# Altium schematic symbol library FPGA_Xilinx_Virtex7.SchLib: 34 symbols (part 8 of 34)
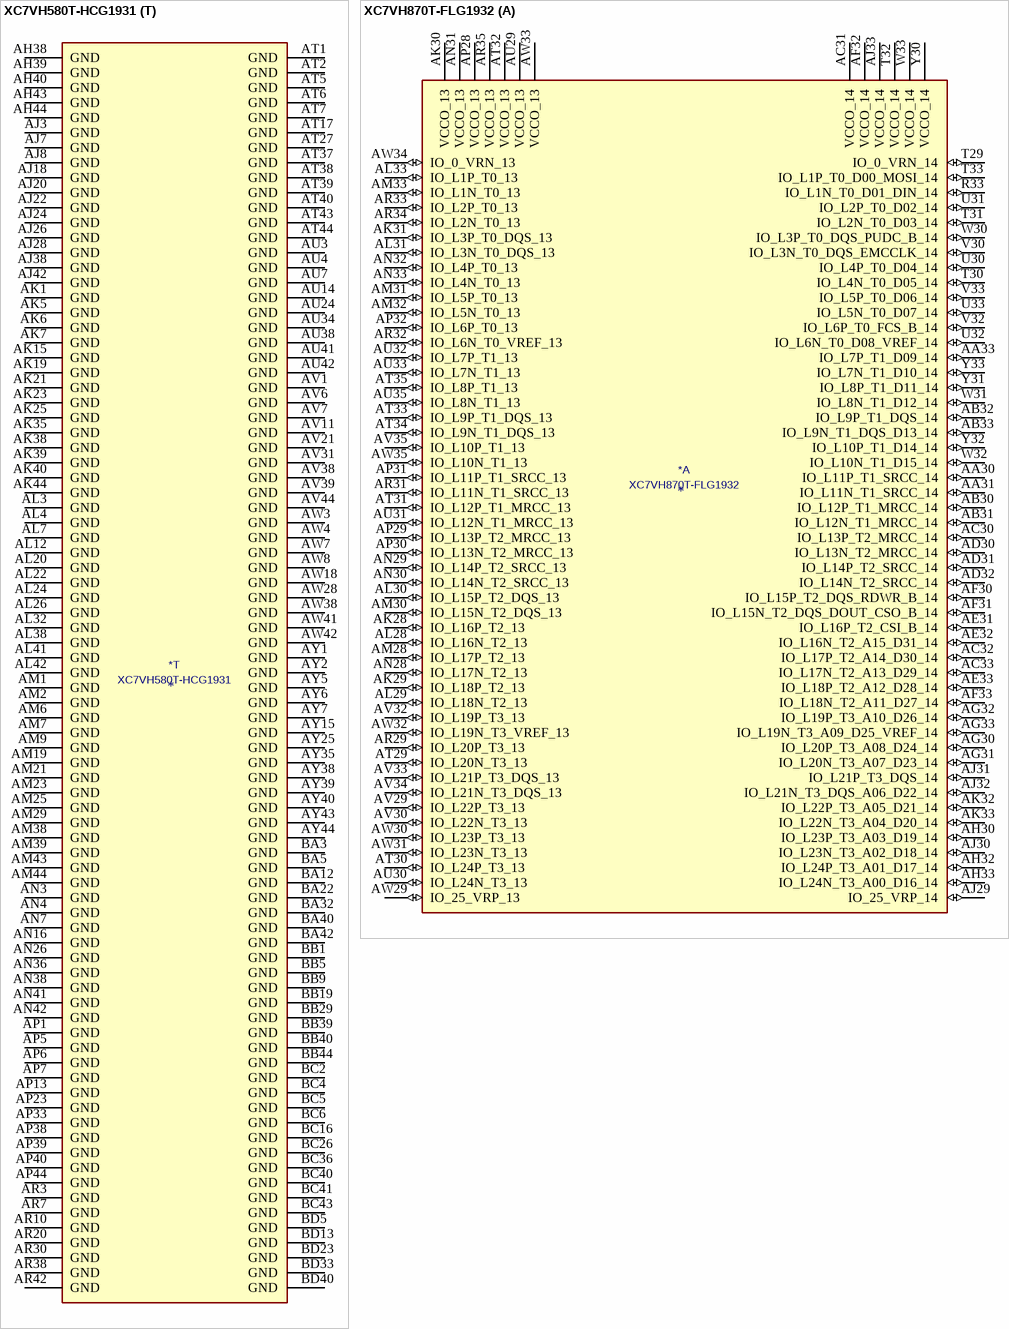
[diagram p179: symbols XC7VH580T-HCG1931 to XC7VH870T-FLG1932]

## XC7VH580T-HCG1931
designator *  value XC7VH580T-HCG1931
ki_keywords: FPGA; ki_description: Virtex 7 HT 580 XC7VH580T-FLG1931
part A pins: AH30 IO_L20P_T3_A08_D24_14 (io), AJ30 IO_L20N_T3_A07_D23_14 (io), AJ31 IO_L16P_T2_CSI_B_14 (io), AJ32 IO_L7P_T1_D09_14 (io), AK30 VCCO_14 (power), AK31 IO_L16N_T2_A15_D31_14 (io), AK32 IO_L7N_T1_D10_14 (io), AL30 IO_L24P_T3_A01_D17_14 (io), AL31 IO_L18P_T2_A12_D28_14 (io), AL35 IO_L1P_T0_13 (io), AL36 IO_L3P_T0_DQS_13 (io), AL37 VCCO_13 (power), AM30 IO_L24N_T3_A00_D16_14 (io), AM31 IO_L18N_T2_A11_D27_14 (io), AM32 IO_L9P_T1_DQS_14 (io), AM33 IO_L5P_T0_D06_14 (io), AM34 VCCO_13 (power), AM35 IO_L1N_T0_13 (io), AM36 IO_L3N_T0_DQS_13 (io), AM37 IO_L5P_T0_13 (io), AN30 IO_L22P_T3_A05_D21_14 (io), AN31 VCCO_14 (power), AN32 IO_L9N_T1_DQS_D13_14 (io), AN33 IO_L5N_T0_D07_14 (io), AN34 IO_L4P_T0_13 (io), AN35 IO_L2P_T0_13 (io), AN37 IO_L5N_T0_13 (io), AP30 IO_L22N_T3_A04_D20_14 (io), AP31 IO_L13P_T2_MRCC_14 (io), AP32 IO_L11P_T1_SRCC_14 (io), AP34 IO_L4N_T0_13 (io), AP35 IO_L2N_T0_13 (io), AP36 IO_L6P_T0_13 (io), AP37 IO_L7P_T1_13 (io), AR31 IO_L13N_T2_MRCC_14 (io), AR32 IO_L11N_T1_SRCC_14 (io), AR33 IO_L1P_T0_D00_MOSI_14 (io), AR34 IO_L10P_T1_13 (io), AR35 VCCO_13 (power), AR36 IO_L6N_T0_VREF_13 (io), AR37 IO_L7N_T1_13 (io), AT30 IO_L21P_T3_DQS_14 (io), AT31 IO_L14P_T2_SRCC_14 (io), AT32 VCCO_14 (power), AT33 IO_L1N_T0_D01_DIN_14 (io), AT34 IO_L10N_T1_13 (io), AT35 IO_L11P_T1_SRCC_13 (io), AT36 IO_L12P_T1_MRCC_13 (io), AU30 IO_L21N_T3_DQS_A06_D22_14 (io), AU31 IO_L14N_T2_SRCC_14 (io), AU32 IO_L12P_T1_MRCC_14 (io), AU33 IO_L3P_T0_DQS_PUDC_B_14 (io), AU35 IO_L11N_T1_SRCC_13 (io), AU36 IO_L12N_T1_MRCC_13 (io), AU37 IO_L9P_T1_DQS_13 (io), AV30 IO_L23P_T3_A03_D19_14 (io), AV32 IO_L12N_T1_MRCC_14 (io), AV33 IO_L3N_T0_DQS_EMCCLK_14 (io), AV34 IO_L16P_T2_13 (io), AV35 IO_L13P_T2_MRCC_13 (io), AV36 VCCO_13 (power), AV37 IO_L9N_T1_DQS_13 (io), AW30 IO_L23N_T3_A02_D18_14 (io), AW31 IO_L15P_T2_DQS_RDWR_B_14 (io), AW32 IO_L8P_T1_D11_14 (io), AW33 VCCO_14 (power), AW34 IO_L16N_T2_13 (io), AW35 IO_L13N_T2_MRCC_13 (io), AW36 IO_L14P_T2_SRCC_13 (io), AW37 IO_L8P_T1_13 (io), AY30 VCCO_14 (power), AY31 IO_L15N_T2_DQS_DOUT_CSO_B_14 (io), AY32 IO_L8N_T1_D12_14 (io), AY33 IO_L4P_T0_D04_14 (io), AY34 IO_L17P_T2_13 (io), AY36 IO_L14N_T2_SRCC_13 (io), AY37 IO_L8N_T1_13 (io), BA30 IO_L19P_T3_A10_D26_14 (io), BA31 IO_L17P_T2_A14_D30_14 (io), BA33 IO_L4N_T0_D05_14 (io), BA34 IO_L17N_T2_13 (io), BA35 IO_L15P_T2_DQS_13 (io), BA36 IO_L18P_T2_13 (io), BA37 VCCO_13 (power), BA38 IO_L22P_T3_13 (io), BA39 IO_L22N_T3_13 (io), BB30 IO_L19N_T3_A09_D25_VREF_14 (io), BB31 IO_L17N_T2_A13_D29_14 (io), BB32 IO_L10P_T1_D14_14 (io), BB33 IO_L6P_T0_FCS_B_14 (io), BB34 VCCO_13 (power), BB35 IO_L15N_T2_DQS_13 (io), BB36 IO_L18N_T2_13 (io), BB37 IO_L21P_T3_DQS_13 (io), BB38 IO_L19P_T3_13 (io), BC30 IO_25_VRP_14 (io), BC31 VCCO_14 (power), BC32 IO_L10N_T1_D15_14 (io), BC33 IO_L6N_T0_D08_VREF_14 (io), BC34 IO_L23P_T3_13 (io), BC35 IO_L24P_T3_13 (io), BC37 IO_L21N_T3_DQS_13 (io), BC38 IO_L19N_T3_VREF_13 (io), BC39 IO_25_VRP_13 (io), BD30 IO_0_VRN_14 (io), BD31 IO_L2P_T0_D02_14 (io), BD32 IO_L2N_T0_D03_14 (io), BD34 IO_L23N_T3_13 (io), BD35 IO_L24N_T3_13 (io), BD36 IO_L20P_T3_13 (io), BD37 IO_L20N_T3_13 (io), BD38 VCCO_13 (power), BD39 IO_0_VRN_13 (io)
part B pins: AA33 IO_L2P_T0_16 (io), AA34 IO_L2N_T0_16 (io), AA35 IO_L3P_T0_DQS_16 (io), AA36 IO_L3N_T0_DQS_16 (io), AA37 VCCO_16 (power), AB32 IO_L1P_T0_16 (io), AB33 IO_L1N_T0_16 (io), AB34 VCCO_16 (power), AB35 IO_L5P_T0_16 (io), AB36 IO_L6P_T0_16 (io), AB37 IO_L6N_T0_VREF_16 (io), AC31 VCCO_16 (power), AC32 IO_L16P_T2_16 (io), AC33 IO_L4P_T0_16 (io), AC34 IO_L4N_T0_16 (io), AC35 IO_L5N_T0_16 (io), AC37 IO_L7P_T1_16 (io), AD32 IO_L16N_T2_16 (io), AD34 IO_L10P_T1_16 (io), AD35 IO_L8P_T1_16 (io), AD36 IO_L8N_T1_16 (io), AD37 IO_L7N_T1_16 (io), AE32 IO_L15P_T2_DQS_16 (io), AE33 IO_L15N_T2_DQS_16 (io), AE34 IO_L10N_T1_16 (io), AE35 VCCO_16 (power), AE36 IO_L9P_T1_DQS_16 (io), AE37 IO_L9N_T1_DQS_16 (io), AF32 VCCO_16 (power), AF33 IO_L11P_T1_SRCC_16 (io), AF34 IO_L11N_T1_SRCC_16 (io), AF35 IO_L12P_T1_MRCC_16 (io), AF36 IO_L12N_T1_MRCC_16 (io), AG31 IO_L17P_T2_16 (io), AG32 IO_L13P_T2_MRCC_16 (io), AG33 IO_L13N_T2_MRCC_16 (io), AG35 IO_L14P_T2_SRCC_16 (io), AG36 IO_L14N_T2_SRCC_16 (io), AG37 IO_L20P_T3_16 (io), AH32 IO_L17N_T2_16 (io), AH33 IO_L18P_T2_16 (io), AH34 IO_L18N_T2_16 (io), AH35 IO_L24P_T3_16 (io), AH36 VCCO_16 (power), AH37 IO_L20N_T3_16 (io), AJ33 VCCO_16 (power), AJ34 IO_L19P_T3_16 (io), AJ35 IO_L24N_T3_16 (io), AJ36 IO_L21P_T3_DQS_16 (io), AJ37 IO_L21N_T3_DQS_16 (io), AK27 IO_25_VRP_15 (io), AK28 IO_L18P_T2_A24_15 (io), AK29 IO_L22P_T3_A17_15 (io), AK33 IO_L23P_T3_16 (io), AK34 IO_L19N_T3_VREF_16 (io), AK36 IO_L22P_T3_16 (io), AK37 IO_L22N_T3_16 (io), AL27 VCCO_15 (power), AL28 IO_L18N_T2_A23_15 (io), AL29 IO_L22N_T3_A16_15 (io), AL33 IO_L23N_T3_16 (io), AL34 IO_25_VRP_16 (io), AM27 IO_L7P_T1_AD2P_15 (io), AM28 IO_L16P_T2_A28_15 (io), AN25 IO_L1P_T0_AD0P_15 (io), AN27 IO_L7N_T1_AD2N_15 (io), AN28 IO_L16N_T2_A27_15 (io), AN29 IO_L20P_T3_A20_15 (io), AP25 IO_L1N_T0_AD0N_15 (io), AP26 IO_L5P_T0_AD9P_15 (io), AP27 IO_L9P_T1_DQS_AD3P_15 (io), AP28 VCCO_15 (power), AP29 IO_L20N_T3_A19_15 (io), AR25 VCCO_15 (power), AR26 IO_L5N_T0_AD9N_15 (io), AR27 IO_L9N_T1_DQS_AD3N_15 (io), AR28 IO_L14P_T2_SRCC_15 (io), AR29 IO_L24P_T3_RS1_15 (io), AT25 IO_L4P_T0_15 (io), AT26 IO_L3P_T0_DQS_AD1P_15 (io), AT28 IO_L14N_T2_SRCC_15 (io), AT29 IO_L24N_T3_RS0_15 (io), AU25 IO_L4N_T0_15 (io), AU26 IO_L3N_T0_DQS_AD1N_15 (io), AU27 IO_L11P_T1_SRCC_15 (io), AU28 IO_L13P_T2_MRCC_15 (io), AU29 VCCO_15 (power), AV25 IO_0_VRN_15 (io), AV26 VCCO_15 (power), AV27 IO_L11N_T1_SRCC_15 (io), AV28 IO_L13N_T2_MRCC_15 (io), AV29 IO_L21P_T3_DQS_15 (io), AW26 IO_L6P_T0_15 (io), AW27 IO_L12P_T1_MRCC_15 (io), AW29 IO_L21N_T3_DQS_A18_15 (io), AY26 IO_L6N_T0_VREF_15 (io), AY27 IO_L12N_T1_MRCC_15 (io), AY28 IO_L15P_T2_DQS_15 (io), AY29 IO_L19P_T3_A22_15 (io), BA26 IO_L2P_T0_AD8P_15 (io), BA27 VCCO_15 (power), BA28 IO_L15N_T2_DQS_ADV_B_15 (io), BA29 IO_L19N_T3_A21_VREF_15 (io), BB26 IO_L2N_T0_AD8N_15 (io), BB27 IO_L10P_T1_AD11P_15 (io), BB28 IO_L17P_T2_A26_15 (io), BC27 IO_L10N_T1_AD11N_15 (io), BC28 IO_L17N_T2_A25_15 (io), BC29 IO_L23P_T3_FOE_B_15 (io), BD26 IO_L8P_T1_AD10P_15 (io), BD27 IO_L8N_T1_AD10N_15 (io), BD28 VCCO_15 (power), BD29 IO_L23N_T3_FWE_B_15 (io), Y37 IO_0_VRN_16 (io)
part C pins: F29 IO_L22P_T3_18 (io), F30 IO_L22N_T3_18 (io), F31 IO_25_VRP_18 (io), F32 VCCO_18 (power), F33 IO_L24P_T3_18 (io), F34 IO_L24N_T3_18 (io), F35 IO_L20P_T3_18 (io), F36 IO_L20N_T3_18 (io), G29 VCCO_18 (power), G30 IO_L23P_T3_18 (io), G31 IO_L23N_T3_18 (io), G32 IO_L21P_T3_DQS_18 (io), G33 IO_L21N_T3_DQS_18 (io), G35 IO_L19P_T3_18 (io), G36 IO_L19N_T3_VREF_18 (io), G37 IO_L7N_T1_18 (io), H29 IO_L17P_T2_18 (io), H30 IO_L17N_T2_18 (io), H32 IO_L15P_T2_DQS_18 (io), H33 IO_L15N_T2_DQS_18 (io), H34 IO_L18P_T2_18 (io), H35 IO_L18N_T2_18 (io), H36 VCCO_18 (power), H37 IO_L7P_T1_18 (io), J29 IO_L16P_T2_18 (io), J30 IO_L16N_T2_18 (io), J31 IO_L14P_T2_SRCC_18 (io), J32 IO_L14N_T2_SRCC_18 (io), J33 VCCO_18 (power), J34 IO_L13P_T2_MRCC_18 (io), J35 IO_L13N_T2_MRCC_18 (io), J36 IO_L9P_T1_DQS_18 (io), J37 IO_L9N_T1_DQS_18 (io), K29 IO_L10N_T1_18 (io), K30 VCCO_18 (power), K31 IO_L11P_T1_SRCC_18 (io), K32 IO_L11N_T1_SRCC_18 (io), K33 IO_L12P_T1_MRCC_18 (io), K34 IO_L12N_T1_MRCC_18 (io), K36 IO_L8N_T1_18 (io), K37 IO_0_VRN_18 (io), L29 IO_L10P_T1_18 (io), L30 IO_L4P_T0_18 (io), L31 IO_L4N_T0_18 (io), L33 IO_L3P_T0_DQS_18 (io), L34 IO_L3N_T0_DQS_18 (io), L35 IO_L6N_T0_VREF_18 (io), L36 IO_L8P_T1_18 (io), L37 VCCO_18 (power), M30 IO_L2P_T0_18 (io), M31 IO_L2N_T0_18 (io), M32 IO_L1P_T0_18 (io), M33 IO_L1N_T0_18 (io), M34 VCCO_18 (power), M35 IO_L6P_T0_18 (io), M36 IO_L5P_T0_18 (io), M37 IO_L5N_T0_18 (io), N29 IO_L4P_T0_17 (io), N30 IO_L4N_T0_17 (io), N31 VCCO_17 (power), N32 IO_L2P_T0_17 (io), N33 IO_L2N_T0_17 (io), N34 IO_L6P_T0_17 (io), N35 IO_L6N_T0_VREF_17 (io), N37 IO_L1N_T0_17 (io), P29 IO_L5P_T0_17 (io), P30 IO_L5N_T0_17 (io), P31 IO_L3P_T0_DQS_17 (io), P32 IO_L3N_T0_DQS_17 (io), P34 IO_0_VRN_17 (io), P35 IO_L15P_T2_DQS_17 (io), P36 IO_L15N_T2_DQS_17 (io), P37 IO_L1P_T0_17 (io), R29 IO_L8N_T1_17 (io), R31 IO_L7P_T1_17 (io), R32 IO_L7N_T1_17 (io), R33 IO_L16P_T2_17 (io), R34 IO_L16N_T2_17 (io), R35 VCCO_17 (power), R36 IO_L18P_T2_17 (io), R37 IO_L18N_T2_17 (io), T29 IO_L8P_T1_17 (io), T30 IO_L9N_T1_DQS_17 (io), T31 IO_L10N_T1_17 (io), T32 VCCO_17 (power), T33 IO_L13P_T2_MRCC_17 (io), T34 IO_L13N_T2_MRCC_17 (io), T35 IO_L14P_T2_SRCC_17 (io), T36 IO_L14N_T2_SRCC_17 (io), U29 VCCO_17 (power), U30 IO_L9P_T1_DQS_17 (io), U31 IO_L10P_T1_17 (io), U32 IO_L11P_T1_SRCC_17 (io), U33 IO_L11N_T1_SRCC_17 (io), U35 IO_L12P_T1_MRCC_17 (io), U36 IO_L12N_T1_MRCC_17 (io), U37 IO_L17N_T2_17 (io), V32 IO_L20P_T3_17 (io), V33 IO_L20N_T3_17 (io), V34 IO_L24P_T3_17 (io), V35 IO_L24N_T3_17 (io), V36 VCCO_17 (power), V37 IO_L17P_T2_17 (io), W32 IO_L19N_T3_VREF_17 (io), W33 VCCO_17 (power), W34 IO_L21P_T3_DQS_17 (io), W35 IO_L21N_T3_DQS_17 (io), W36 IO_L23P_T3_17 (io), W37 IO_L23N_T3_17 (io), Y32 IO_L19P_T3_17 (io), Y33 IO_L22P_T3_17 (io), Y34 IO_L22N_T3_17 (io), Y36 IO_25_VRP_17 (io)
part D pins: AH14 IO_L6P_T0_33 (io), AH15 IO_L10P_T1_33 (io), AJ13 VCCO_33 (power), AJ14 IO_L6N_T0_VREF_33 (io), AJ15 IO_L10N_T1_33 (io), AK13 IO_L3P_T0_DQS_33 (io), AK14 IO_L2P_T0_33 (io), AL13 IO_L3N_T0_DQS_33 (io), AL14 IO_L2N_T0_33 (io), AL15 IO_L7P_T1_33 (io), AM12 IO_L1P_T0_33 (io), AM13 IO_L4P_T0_33 (io), AM14 VCCO_33 (power), AM15 IO_L7N_T1_33 (io), AN11 VCCO_32 (power), AN12 IO_L1N_T0_33 (io), AN13 IO_L4N_T0_33 (io), AN14 IO_L9P_T1_DQS_33 (io), AN15 IO_L8P_T1_33 (io), AP8 VCCO_32 (power), AP12 IO_L5P_T0_33 (io), AP14 IO_L9N_T1_DQS_33 (io), AP15 IO_L8N_T1_33 (io), AR12 IO_L5N_T0_33 (io), AR13 IO_L12P_T1_MRCC_33 (io), AR14 IO_L11P_T1_SRCC_33 (io), AR15 VCCO_33 (power), AT12 VCCO_33 (power), AT13 IO_L12N_T1_MRCC_33 (io), AT14 IO_L11N_T1_SRCC_33 (io), AT15 IO_L18P_T2_33 (io), AU9 VCCO_32 (power), AU12 IO_L15P_T2_DQS_33 (io), AU13 IO_L13P_T2_MRCC_33 (io), AU15 IO_L18N_T2_33 (io), AV12 IO_L15N_T2_DQS_33 (io), AV13 IO_L13N_T2_MRCC_33 (io), AV14 IO_L14P_T2_SRCC_33 (io), AV15 IO_L16P_T2_33 (io), AW12 IO_L17P_T2_33 (io), AW13 VCCO_33 (power), AW14 IO_L14N_T2_SRCC_33 (io), AW15 IO_L16N_T2_33 (io), AY10 VCCO_32 (power), AY12 IO_L17N_T2_33 (io), AY13 IO_L19P_T3_33 (io), AY14 IO_L20P_T3_33 (io), BA7 VCCO_32 (power), BA13 IO_L19N_T3_VREF_33 (io), BA14 IO_L20N_T3_33 (io), BA15 IO_L23P_T3_33 (io), BB12 IO_L21N_T3_DQS_33 (io), BB13 IO_L21P_T3_DQS_33 (io), BB14 VCCO_33 (power), BB15 IO_L23N_T3_33 (io), BC11 VCCO_32 (power), BC12 IO_L24N_T3_33 (io), BC13 IO_L24P_T3_33 (io), BC14 IO_L22N_T3_33 (io), BC15 IO_L22P_T3_33 (io), BD8 VCCO_32 (power), BD12 IO_0_VRN_33 (io), BD14 IO_25_VRP_33 (io)
part E pins: AH16 VCCO_34 (power), AJ16 IO_L23P_T3_34 (io), AK16 IO_L23N_T3_34 (io), AK17 IO_L19P_T3_34 (io), AL16 IO_L19N_T3_VREF_34 (io), AL17 VCCO_34 (power), AL18 IO_L21P_T3_DQS_34 (io), AM16 IO_L24N_T3_34 (io), AM17 IO_L24P_T3_34 (io), AM18 IO_L21N_T3_DQS_34 (io), AN17 IO_L20N_T3_34 (io), AN18 IO_L20P_T3_34 (io), AN19 IO_L22P_T3_34 (io), AN20 IO_L22P_T3_35 (io), AN21 VCCO_35 (power), AN22 IO_L7N_T1_AD6N_35 (io), AN23 IO_L7P_T1_AD6P_35 (io), AN24 IO_L1P_T0_AD4P_35 (io), AP16 IO_L16P_T2_34 (io), AP17 IO_L17P_T2_34 (io), AP18 VCCO_34 (power), AP19 IO_L22N_T3_34 (io), AP20 IO_L22N_T3_35 (io), AP21 IO_L16P_T2_35 (io), AP22 IO_L18P_T2_35 (io), AP24 IO_L1N_T0_AD4N_35 (io), AR16 IO_L16N_T2_34 (io), AR17 IO_L17N_T2_34 (io), AR18 IO_L15P_T2_DQS_34 (io), AR19 IO_L18P_T2_34 (io), AR21 IO_L16N_T2_35 (io), AR22 IO_L18N_T2_35 (io), AR23 IO_L9P_T1_DQS_AD7P_35 (io), AR24 IO_L5P_T0_AD13P_35 (io), AT16 IO_L10P_T1_34 (io), AT18 IO_L15N_T2_DQS_34 (io), AT19 IO_L18N_T2_34 (io), AT20 IO_L20P_T3_35 (io), AT21 IO_L15P_T2_DQS_35 (io), AT22 VCCO_35 (power), AT23 IO_L9N_T1_DQS_AD7N_35 (io), AT24 IO_L5N_T0_AD13N_35 (io), AU16 IO_L10N_T1_34 (io), AU17 IO_L14N_T2_SRCC_34 (io), AU18 IO_L14P_T2_SRCC_34 (io), AU19 VCCO_34 (power), AU20 IO_L20N_T3_35 (io), AU21 IO_L15N_T2_DQS_35 (io), AU22 IO_L14P_T2_SRCC_35 (io), AU23 IO_L12P_T1_MRCC_35 (io), AV16 VCCO_34 (power), AV17 IO_L13N_T2_MRCC_34 (io), AV18 IO_L13P_T2_MRCC_34 (io), AV19 IO_L8P_T1_34 (io), AV20 IO_L24P_T3_35 (io), AV22 IO_L14N_T2_SRCC_35 (io), AV23 IO_L12N_T1_MRCC_35 (io), AV24 IO_L3P_T0_DQS_AD5P_35 (io), AW16 IO_L9P_T1_DQS_34 (io), AW17 IO_L11P_T1_SRCC_34 (io), AW19 IO_L8N_T1_34 (io), AW20 IO_L24N_T3_35 (io), AW21 IO_L21P_T3_DQS_35 (io), AW22 IO_L13P_T2_MRCC_35 (io), AW23 VCCO_35 (power), AW24 IO_L3N_T0_DQS_AD5N_35 (io), AW25 IO_0_VRN_35 (io), AY16 IO_L9N_T1_DQS_34 (io), AY17 IO_L11N_T1_SRCC_34 (io), AY18 IO_L12N_T1_MRCC_34 (io), AY19 IO_L12P_T1_MRCC_34 (io), AY20 VCCO_35 (power), AY21 IO_L21N_T3_DQS_35 (io), AY22 IO_L13N_T2_MRCC_35 (io), AY23 IO_L11P_T1_SRCC_35 (io), AY24 IO_L4P_T0_35 (io), BA16 IO_L6P_T0_34 (io), BA17 VCCO_34 (power), BA18 IO_L4P_T0_34 (io), BA19 IO_L7N_T1_34 (io), BA20 IO_L7P_T1_34 (io), BA21 IO_L23P_T3_35 (io), BA23 IO_L11N_T1_SRCC_35 (io), BA24 IO_L4N_T0_35 (io), BA25 IO_L2P_T0_AD12P_35 (io), BB16 IO_L6N_T0_VREF_34 (io), BB17 IO_L5P_T0_34 (io), BB18 IO_L4N_T0_34 (io), BB20 IO_25_VRP_35 (io), BB21 IO_L23N_T3_35 (io), BB22 IO_L17P_T2_35 (io), BB23 IO_L8P_T1_AD14P_35 (io), BB24 VCCO_35 (power), BB25 IO_L2N_T0_AD12N_35 (io), BC17 IO_L5N_T0_34 (io), BC18 IO_L3N_T0_DQS_34 (io), BC19 IO_L3P_T0_DQS_34 (io), BC20 IO_0_VRN_34 (io), BC21 VCCO_35 (power), BC22 IO_L17N_T2_35 (io), BC23 IO_L8N_T1_AD14N_35 (io), BC24 IO_L10P_T1_AD15P_35 (io), BC25 IO_L6P_T0_35 (io), BD15 IO_25_VRP_34 (io), BD16 IO_L2N_T0_34 (io), BD17 IO_L2P_T0_34 (io), BD18 VCCO_34 (power), BD19 IO_L1N_T0_34 (io), BD20 IO_L1P_T0_34 (io), BD21 IO_L19N_T3_VREF_35 (io), BD22 IO_L19P_T3_35 (io), BD24 IO_L10N_T1_AD15N_35 (io), BD25 IO_L6N_T0_VREF_35 (io)
part F pins: AA8 IO_L19N_T3_VREF_36 (io), AA9 IO_L20P_T3_36 (io), AA10 IO_L21N_T3_DQS_36 (io), AA11 IO_L21P_T3_DQS_36 (io), AA13 IO_L23N_T3_36 (io), AB8 IO_L19P_T3_36 (io), AB10 IO_L16P_T2_36 (io), AB11 IO_L24N_T3_36 (io), AB12 IO_L24P_T3_36 (io), AB13 IO_L23P_T3_36 (io), AB14 VCCO_36 (power), AC8 IO_L17N_T2_36 (io), AC9 IO_L17P_T2_36 (io), AC10 IO_L16N_T2_36 (io), AC11 VCCO_36 (power), AC12 IO_L22N_T3_36 (io), AC13 IO_L22P_T3_36 (io), AD8 VCCO_36 (power), AD9 IO_L13N_T2_MRCC_36 (io), AD10 IO_L13P_T2_MRCC_36 (io), AD11 IO_L14P_T2_SRCC_36 (io), AD12 IO_L8P_T1_36 (io), AE8 IO_L18P_T2_36 (io), AE9 IO_L15P_T2_DQS_36 (io), AE11 IO_L14N_T2_SRCC_36 (io), AE12 IO_L8N_T1_36 (io), AE13 IO_L10P_T1_36 (io), AF8 IO_L18N_T2_36 (io), AF9 IO_L15N_T2_DQS_36 (io), AF10 IO_L12P_T1_MRCC_36 (io), AF11 IO_L11P_T1_SRCC_36 (io), AF12 VCCO_36 (power), AF13 IO_L10N_T1_36 (io), AG8 IO_L6P_T0_36 (io), AG9 VCCO_36 (power), AG10 IO_L12N_T1_MRCC_36 (io), AG11 IO_L11N_T1_SRCC_36 (io), AG12 IO_L9P_T1_DQS_36 (io), AG13 IO_L7P_T1_36 (io), AH8 IO_L6N_T0_VREF_36 (io), AH9 IO_L4N_T0_36 (io), AH10 IO_L4P_T0_36 (io), AH12 IO_L9N_T1_DQS_36 (io), AH13 IO_L7N_T1_36 (io), AJ9 IO_L3N_T0_DQS_36 (io), AJ10 IO_L3P_T0_DQS_36 (io), AJ11 IO_L5P_T0_36 (io), AJ12 IO_L1P_T0_36 (io), AK8 IO_L2N_T0_36 (io), AK9 IO_L2P_T0_36 (io), AK10 VCCO_36 (power), AK11 IO_L5N_T0_36 (io), AK12 IO_L1N_T0_36 (io), AL11 IO_0_VRN_36 (io), M8 IO_L1N_T0_37 (io), N8 IO_L1P_T0_37 (io), N9 IO_L6N_T0_VREF_37 (io), N10 IO_L6P_T0_37 (io), N11 VCCO_37 (power), N12 IO_L2N_T0_37 (io), N13 IO_L2P_T0_37 (io), N14 IO_L5N_T0_37 (io), N15 IO_0_VRN_37 (io), P8 VCCO_37 (power), P9 IO_L18N_T2_37 (io), P10 IO_L18P_T2_37 (io), P11 IO_L3N_T0_DQS_37 (io), P12 IO_L3P_T0_DQS_37 (io), P14 IO_L5P_T0_37 (io), P15 IO_L4N_T0_37 (io), P16 IO_L4P_T0_37 (io), R8 IO_L16N_T2_37 (io), R9 IO_L15N_T2_DQS_37 (io), R11 IO_L14N_T2_SRCC_37 (io), R12 IO_L14P_T2_SRCC_37 (io), R13 IO_L8P_T1_37 (io), R14 IO_L8N_T1_37 (io), R15 VCCO_37 (power), R16 IO_L7N_T1_37 (io), T8 IO_L16P_T2_37 (io), T9 IO_L15P_T2_DQS_37 (io), T10 IO_L13N_T2_MRCC_37 (io), T11 IO_L13P_T2_MRCC_37 (io), T12 VCCO_37 (power), T13 IO_L9N_T1_DQS_37 (io), T14 IO_L9P_T1_DQS_37 (io), T15 IO_L10P_T1_37 (io), T16 IO_L7P_T1_37 (io), U8 IO_L17N_T2_37 (io), U9 VCCO_37 (power), U10 IO_L12N_T1_MRCC_37 (io), U11 IO_L12P_T1_MRCC_37 (io), U12 IO_L11N_T1_SRCC_37 (io), U13 IO_L11P_T1_SRCC_37 (io), U15 IO_L10N_T1_37 (io), V8 IO_L17P_T2_37 (io), V9 IO_L19N_T3_VREF_37 (io), V10 IO_L19P_T3_37 (io), V12 IO_L24N_T3_37 (io), V13 IO_L24P_T3_37 (io), V14 IO_L20N_T3_37 (io), W9 IO_L23N_T3_37 (io), W10 IO_L23P_T3_37 (io), W11 IO_L21N_T3_DQS_37 (io), W12 IO_L21P_T3_DQS_37 (io), W13 VCCO_37 (power), W14 IO_L20P_T3_37 (io), Y8 IO_25_VRP_36 (io), Y9 IO_L20N_T3_36 (io), Y10 VCCO_36 (power), Y11 IO_L22N_T3_37 (io), Y12 IO_L22P_T3_37 (io), Y13 IO_25_VRP_37 (io)
part G pins: F8 IO_0_VRN_38 (io), F9 IO_25_VRP_38 (io), F10 IO_L20N_T3_38 (io), F11 IO_L20P_T3_38 (io), F12 VCCO_38 (power), F13 IO_L24N_T3_38 (io), F14 IO_L24P_T3_38 (io), F15 IO_L22N_T3_38 (io), F16 IO_L22P_T3_38 (io), G8 IO_L7N_T1_38 (io), G9 VCCO_38 (power), G10 IO_L19N_T3_VREF_38 (io), G11 IO_L19P_T3_38 (io), G12 IO_L21N_T3_DQS_38 (io), G13 IO_L21P_T3_DQS_38 (io), G15 IO_L23N_T3_38 (io), G16 IO_L23P_T3_38 (io), H8 IO_L7P_T1_38 (io), H9 IO_L18N_T2_38 (io), H10 IO_L18P_T2_38 (io), H12 IO_L14N_T2_SRCC_38 (io), H13 IO_L14P_T2_SRCC_38 (io), H14 IO_L17N_T2_38 (io), H15 IO_L17P_T2_38 (io), H16 VCCO_38 (power), J9 IO_L9N_T1_DQS_38 (io), J10 IO_L9P_T1_DQS_38 (io), J11 IO_L13N_T2_MRCC_38 (io), J12 IO_L13P_T2_MRCC_38 (io), J13 VCCO_38 (power), J14 IO_L15N_T2_DQS_38 (io), J15 IO_L15P_T2_DQS_38 (io), J16 IO_L16N_T2_38 (io), K8 IO_L8N_T1_38 (io), K9 IO_L8P_T1_38 (io), K10 VCCO_38 (power), K11 IO_L12N_T1_MRCC_38 (io), K12 IO_L12P_T1_MRCC_38 (io), K13 IO_L11N_T1_SRCC_38 (io), K14 IO_L11P_T1_SRCC_38 (io), K16 IO_L16P_T2_38 (io), L8 IO_L10N_T1_38 (io), L9 IO_L10P_T1_38 (io), L10 IO_L6N_T0_VREF_38 (io), L11 IO_L5N_T0_38 (io), L13 IO_L3N_T0_DQS_38 (io), L14 IO_L3P_T0_DQS_38 (io), L15 IO_L4N_T0_38 (io), L16 IO_L4P_T0_38 (io), M10 IO_L6P_T0_38 (io), M11 IO_L5P_T0_38 (io), M12 IO_L1N_T0_38 (io), M13 IO_L1P_T0_38 (io), M14 VCCO_38 (power), M15 IO_L2N_T0_38 (io), M16 IO_L2P_T0_38 (io)
part H pins: AJ5 MGTREFCLK0N_114 (io), AJ6 MGTREFCLK0P_114 (io), AK3 MGTHRXN3_114 (io), AK4 MGTHRXP3_114 (io), AL1 MGTHTXN3_114 (io), AL2 MGTHTXP3_114 (io), AL5 MGTREFCLK1N_114 (io), AL6 MGTREFCLK1P_114 (io), AM3 MGTHRXN2_114 (io), AM4 MGTHRXP2_114 (io), AN1 MGTHTXN2_114 (io), AN2 MGTHTXP2_114 (io), AN5 MGTREFCLK0N_113 (io), AN6 MGTREFCLK0P_113 (io), AP3 MGTHRXN1_114 (io), AP4 MGTHRXP1_114 (io), AR1 MGTHTXN1_114 (io), AR2 MGTHTXP1_114 (io), AR5 MGTREFCLK1N_113 (io), AR6 MGTREFCLK1P_113 (io), AT3 MGTHRXN0_114 (io), AT4 MGTHRXP0_114 (io), AU1 MGTHTXN0_114 (io), AU2 MGTHTXP0_114 (io), AU5 MGTHRXN3_113 (io), AU6 MGTHRXP3_113 (io), AV3 MGTHRXN2_113 (io), AV4 MGTHRXP2_113 (io), AW1 MGTHTXN3_113 (io), AW2 MGTHTXP3_113 (io), AW5 MGTHRXN1_113 (io), AW6 MGTHRXP1_113 (io), AY3 MGTHRXN0_113 (io), AY4 MGTHRXP0_113 (io), BA1 MGTHTXN2_113 (io), BA2 MGTHTXP2_113 (io), BB3 MGTHTXN1_113 (io), BB4 MGTHTXP1_113 (io), BD3 MGTHTXN0_113 (io), BD4 MGTHTXP0_113 (io)
part I pins: AA1 MGTHTXN0_116 (io), AA2 MGTHTXP0_116 (io), AA5 MGTREFCLK1N_116 (io), AA6 MGTREFCLK1P_116 (io), AB3 MGTHRXN3_115 (io), AB4 MGTHRXP3_115 (io), AC1 MGTHTXN3_115 (io), AC2 MGTHTXP3_115 (io), AC5 MGTREFCLK0N_115 (io), AC6 MGTREFCLK0P_115 (io), AD3 MGTHRXN2_115 (io), AD4 MGTHRXP2_115 (io), AE1 MGTHTXN2_115 (io), AE2 MGTHTXP2_115 (io), AE5 MGTREFCLK1N_115 (io), AE6 MGTREFCLK1P_115 (io), AF3 MGTHRXN1_115 (io), AF4 MGTHRXP1_115 (io), AG1 MGTHTXN1_115 (io), AG2 MGTHTXP1_115 (io), AH3 MGTHRXN0_115 (io), AH4 MGTHRXP0_115 (io), AJ1 MGTHTXN0_115 (io), AJ2 MGTHTXP0_115 (io), P3 MGTHRXN3_116 (io), P4 MGTHRXP3_116 (io), R1 MGTHTXN3_116 (io), R2 MGTHTXP3_116 (io), T3 MGTHRXN2_116 (io), T4 MGTHRXP2_116 (io), U1 MGTHTXN2_116 (io), U2 MGTHTXP2_116 (io), U5 MGTREFCLK0N_116 (io), U6 MGTREFCLK0P_116 (io), V3 MGTHRXN1_116 (io), V4 MGTHRXP1_116 (io), W1 MGTHTXN1_116 (io), W2 MGTHTXP1_116 (io), Y3 MGTHRXN0_116 (io), Y4 MGTHRXP0_116 (io)
part J pins: A5 MGTHRXN3_118 (io), A6 MGTHRXP3_118 (io), B3 MGTHTXN3_118 (io), B4 MGTHTXP3_118 (io), C1 MGTHTXN1_118 (io), C2 MGTHTXP1_118 (io), C5 MGTHRXN2_118 (io), C6 MGTHRXP2_118 (io), D3 MGTHTXN2_118 (io), D4 MGTHTXP2_118 (io), E1 MGTHTXN0_118 (io), E2 MGTHTXP0_118 (io), E5 MGTHRXN1_118 (io), E6 MGTHRXP1_118 (io), F3 MGTHRXN3_117 (io), F4 MGTHRXP3_117 (io), G1 MGTHTXN3_117 (io), G2 MGTHTXP3_117 (io), G5 MGTHRXN0_118 (io), G6 MGTHRXP0_118 (io), H3 MGTHRXN2_117 (io), H4 MGTHRXP2_117 (io), J1 MGTHTXN2_117 (io), J2 MGTHTXP2_117 (io), J5 MGTREFCLK0N_118 (io), J6 MGTREFCLK0P_118 (io), K3 MGTHRXN1_117 (io), K4 MGTHRXP1_117 (io), L1 MGTHTXN1_117 (io), L2 MGTHTXP1_117 (io), L5 MGTREFCLK1N_118 (io), L6 MGTREFCLK1P_118 (io), M3 MGTHRXN0_117 (io), M4 MGTHRXP0_117 (io), N1 MGTHTXN0_117 (io), N2 MGTHTXP0_117 (io), N5 MGTREFCLK0N_117 (io), N6 MGTREFCLK0P_117 (io), R5 MGTREFCLK1N_117 (io), R6 MGTREFCLK1P_117 (io)
part K pins: AJ39 MGTREFCLK0P_214 (io), AJ40 MGTREFCLK0N_214 (io), AK41 MGTHRXP3_214 (io), AK42 MGTHRXN3_214 (io), AL39 MGTREFCLK1P_214 (io), AL40 MGTREFCLK1N_214 (io), AL43 MGTHTXP3_214 (io), AL44 MGTHTXN3_214 (io), AM41 MGTHRXP2_214 (io), AM42 MGTHRXN2_214 (io), AN39 MGTREFCLK0P_213 (io), AN40 MGTREFCLK0N_213 (io), AN43 MGTHTXP2_214 (io), AN44 MGTHTXN2_214 (io), AP41 MGTHRXP1_214 (io), AP42 MGTHRXN1_214 (io), AR39 MGTREFCLK1P_213 (io), AR40 MGTREFCLK1N_213 (io), AR43 MGTHTXP1_214 (io), AR44 MGTHTXN1_214 (io), AT41 MGTHRXP0_214 (io), AT42 MGTHRXN0_214 (io), AU39 MGTHRXP3_213 (io), AU40 MGTHRXN3_213 (io), AU43 MGTHTXP0_214 (io), AU44 MGTHTXN0_214 (io), AV41 MGTHRXP2_213 (io), AV42 MGTHRXN2_213 (io), AW39 MGTHRXP1_213 (io), AW40 MGTHRXN1_213 (io), AW43 MGTHTXP3_213 (io), AW44 MGTHTXN3_213 (io), AY41 MGTHRXP0_213 (io), AY42 MGTHRXN0_213 (io), BA43 MGTHTXP2_213 (io), BA44 MGTHTXN2_213 (io), BB41 MGTHTXP1_213 (io), BB42 MGTHTXN1_213 (io), BD41 MGTHTXP0_213 (io), BD42 MGTHTXN0_213 (io)
part L pins: AA39 MGTREFCLK1P_216 (io), AA40 MGTREFCLK1N_216 (io), AA43 MGTHTXP0_216 (io), AA44 MGTHTXN0_216 (io), AB41 MGTHRXP3_215 (io), AB42 MGTHRXN3_215 (io), AC39 MGTREFCLK0P_215 (io), AC40 MGTREFCLK0N_215 (io), AC43 MGTHTXP3_215 (io), AC44 MGTHTXN3_215 (io), AD41 MGTHRXP2_215 (io), AD42 MGTHRXN2_215 (io), AE39 MGTREFCLK1P_215 (io), AE40 MGTREFCLK1N_215 (io), AE43 MGTHTXP2_215 (io), AE44 MGTHTXN2_215 (io), AF41 MGTHRXP1_215 (io), AF42 MGTHRXN1_215 (io), AG43 MGTHTXP1_215 (io), AG44 MGTHTXN1_215 (io), AH41 MGTHRXP0_215 (io), AH42 MGTHRXN0_215 (io), AJ43 MGTHTXP0_215 (io), AJ44 MGTHTXN0_215 (io), P41 MGTHRXP3_216 (io), P42 MGTHRXN3_216 (io), R43 MGTHTXP3_216 (io), R44 MGTHTXN3_216 (io), T41 MGTHRXP2_216 (io), T42 MGTHRXN2_216 (io), U39 MGTREFCLK0P_216 (io), U40 MGTREFCLK0N_216 (io), U43 MGTHTXP2_216 (io), U44 MGTHTXN2_216 (io), V41 MGTHRXP1_216 (io), V42 MGTHRXN1_216 (io), W43 MGTHTXP1_216 (io), W44 MGTHTXN1_216 (io), Y41 MGTHRXP0_216 (io), Y42 MGTHRXN0_216 (io)
part M pins: A39 MGTHRXP3_218 (io), A40 MGTHRXN3_218 (io), B41 MGTHTXP3_218 (io), B42 MGTHTXN3_218 (io), C39 MGTHRXP2_218 (io), C40 MGTHRXN2_218 (io), C43 MGTHTXP1_218 (io), C44 MGTHTXN1_218 (io), D41 MGTHTXP2_218 (io), D42 MGTHTXN2_218 (io), E39 MGTHRXP1_218 (io), E40 MGTHRXN1_218 (io), E43 MGTHTXP0_218 (io), E44 MGTHTXN0_218 (io), F41 MGTHRXP3_217 (io), F42 MGTHRXN3_217 (io), G39 MGTHRXP0_218 (io), G40 MGTHRXN0_218 (io), G43 MGTHTXP3_217 (io), G44 MGTHTXN3_217 (io), H41 MGTHRXP2_217 (io), H42 MGTHRXN2_217 (io), J39 MGTREFCLK0P_218 (io), J40 MGTREFCLK0N_218 (io), J43 MGTHTXP2_217 (io), J44 MGTHTXN2_217 (io), K41 MGTHRXP1_217 (io), K42 MGTHRXN1_217 (io), L39 MGTREFCLK1P_218 (io), L40 MGTREFCLK1N_218 (io), L43 MGTHTXP1_217 (io), L44 MGTHTXN1_217 (io), M41 MGTHRXP0_217 (io), M42 MGTHRXN0_217 (io), N39 MGTREFCLK0P_217 (io), N40 MGTREFCLK0N_217 (io), N43 MGTHTXP0_217 (io), N44 MGTHTXN0_217 (io), R39 MGTREFCLK1P_217 (io), R40 MGTREFCLK1N_217 (io)
part N pins: AA3 MGTAVTT_G12 (power), AA42 MGTAVTT_G22 (power), AB2 MGTAVTT_G12 (power), AB6 MGTVCCAUX_G12 (power), AB39 MGTVCCAUX_G22 (power), AB43 MGTAVTT_G22 (power), AC4 MGTAVCC_G11 (power), AC41 MGTAVCC_G21 (power), AD2 MGTAVTT_G11 (power), AD6 MGTVCCAUX_G11 (power), AD39 MGTVCCAUX_G21 (power), AD43 MGTAVTT_G21 (power), AF2 MGTAVTT_G11 (power), AF5 MGTAVCC_G11 (power), AF40 MGTAVCC_G21 (power), AF43 MGTAVTT_G21 (power), AG3 MGTAVTT_G11 (power), AG5 MGTRREF_115 (power), AG6 MGTAVTTRCAL_115 (power), AG39 MGTAVTTRCAL_215 (power), AG40 MGTRREF_215 (power), AG42 MGTAVTT_G21 (power), AJ4 MGTAVCC_G11 (power), AJ41 MGTAVCC_G21 (power), AK2 MGTAVTT_G11 (power), AK43 MGTAVTT_G21 (power), AM5 MGTAVCC_G11 (power), AM40 MGTAVCC_G21 (power), AP2 MGTAVTT_G11 (power), AP43 MGTAVTT_G21 (power), AR4 MGTAVCC_G11 (power), AR41 MGTAVCC_G21 (power), AV2 MGTAVTT_G11 (power), AV5 MGTAVCC_G11 (power), AV40 MGTAVCC_G21 (power), AV43 MGTAVTT_G21 (power), B5 MGTAVCC_G12 (power), B40 MGTAVCC_G22 (power), BA4 MGTAVCC_G11 (power), BA41 MGTAVCC_G21 (power), BB2 MGTAVTT_G11 (power), BB43 MGTAVTT_G21 (power), BC3 MGTAVTT_G11 (power), BC42 MGTAVTT_G21 (power), C3 MGTAVTT_G12 (power), C42 MGTAVTT_G22 (power), D2 MGTAVTT_G12 (power), D43 MGTAVTT_G22 (power), E4 MGTAVCC_G12 (power), E41 MGTAVCC_G22 (power), F2 MGTAVTT_G12 (power), F43 MGTAVTT_G22 (power), H5 MGTAVCC_G12 (power), H40 MGTAVCC_G22 (power), K2 MGTAVTT_G12 (power), K43 MGTAVTT_G22 (power), L4 MGTAVCC_G12 (power), L41 MGTAVCC_G22 (power), P2 MGTAVTT_G12 (power), P5 MGTAVCC_G12 (power), P40 MGTAVCC_G22 (power), P43 MGTAVTT_G22 (power), U4 MGTAVCC_G12 (power), U41 MGTAVCC_G22 (power), V2 MGTAVTT_G12 (power), V43 MGTAVTT_G22 (power), W5 MGTRREF_118 (power), W6 MGTAVTTRCAL_118 (power), W39 MGTAVTTRCAL_218 (power), W40 MGTRREF_218 (power), Y5 MGTAVCC_G12 (power), Y40 MGTAVCC_G22 (power)
part O pins: A9 MGTZRXN7_300 (io), A10 MGTZRXP7_300 (io), A12 MGTZRXN5_300 (io), A13 MGTZRXP5_300 (io), A16 MGTZTXN7_300 (io), A17 MGTZTXP7_300 (io), A19 MGTZTXN5_300 (io), A20 MGTZTXP5_300 (io), A24 MGTZRXN3_300 (io), A25 MGTZRXP3_300 (io), A27 MGTZRXN1_300 (io), A28 MGTZRXP1_300 (io), A31 MGTZTXN3_300 (io), A32 MGTZTXP3_300 (io), A34 MGTZTXN1_300 (io), A35 MGTZTXP1_300 (io), C10 MGTZRXN6_300 (io), C11 MGTZRXP6_300 (io), C13 MGTZRXN4_300 (io), C14 MGTZRXP4_300 (io), C17 MGTZTXN6_300 (io), C18 MGTZTXP6_300 (io), C20 MGTZTXN4_300 (io), C21 MGTZTXP4_300 (io), C25 MGTZRXN2_300 (io), C26 MGTZRXP2_300 (io), C28 MGTZRXN0_300 (io), C29 MGTZRXP0_300 (io), C32 MGTZTXN2_300 (io), C33 MGTZTXP2_300 (io), C35 MGTZTXN0_300 (io), C36 MGTZTXP0_300 (io), E20 MGTZREFCLK0N_300 (io), E21 MGTZREFCLK0P_300 (io), E24 MGTZREFCLK1P_300 (io), E25 MGTZREFCLK1N_300 (io), G20 MGTZ_THERM_IN_300 (io), G21 MGTZ_THERM_OUT_300 (io), H22 MGTZ_OBS_CLK_N_300 (io), J22 MGTZ_OBS_CLK_P_300 (io)
part P pins: A8 MGTZAGND_300 (power), A11 MGTZAGND_300 (power), A14 MGTZAGND_300 (power), A15 MGTZAGND_300 (power), A18 MGTZAGND_300 (power), A21 MGTZAGND_300 (power), A22 MGTZAGND_300 (power), A23 MGTZAGND_300 (power), A26 MGTZAGND_300 (power), A29 MGTZAGND_300 (power), A30 MGTZAGND_300 (power), A33 MGTZAGND_300 (power), A36 MGTZAGND_300 (power), A37 MGTZAGND_300 (power), B8 MGTZAGND_300 (power), B9 MGTZAVCC_300 (power), B10 MGTZAGND_300 (power), B11 MGTZAVCC_300 (power), B12 MGTZAGND_300 (power), B13 MGTZAVCC_300 (power), B14 MGTZAGND_300 (power), B15 MGTZAVCC_300 (power), B16 MGTZAGND_300 (power), B17 MGTZAVCC_300 (power), B18 MGTZAGND_300 (power), B19 MGTZAVCC_300 (power), B20 MGTZAGND_300 (power), B21 MGTZAVCC_300 (power), B22 MGTZAGND_300 (power), B23 MGTZAVCC_300 (power), B24 MGTZAGND_300 (power), B25 MGTZAVCC_300 (power), B26 MGTZAGND_300 (power), B27 MGTZAVCC_300 (power), B28 MGTZAGND_300 (power), B29 MGTZAVCC_300 (power), B30 MGTZAGND_300 (power), B31 MGTZAVCC_300 (power), B32 MGTZAGND_300 (power), B33 MGTZAVCC_300 (power), B34 MGTZAGND_300 (power), B35 MGTZAVCC_300 (power), B36 MGTZAGND_300 (power), B37 MGTZAVCC_300 (power), C8 MGTZAGND_300 (power), C9 MGTZAGND_300 (power), C12 MGTZAGND_300 (power), C15 MGTZAGND_300 (power), C16 MGTZAGND_300 (power), C19 MGTZAGND_300 (power), C22 MGTZAGND_300 (power), C23 MGTZAGND_300 (power), C24 MGTZAGND_300 (power), C27 MGTZAGND_300 (power), C30 MGTZAGND_300 (power), C31 MGTZAGND_300 (power), C34 MGTZAGND_300 (power), C37 MGTZAGND_300 (power), D8 MGTZAGND_300 (power), D9 MGTZAGND_300 (power), D10 MGTZAGND_300 (power), D11 MGTZAGND_300 (power), D12 MGTZAGND_300 (power), D13 MGTZAGND_300 (power), D14 MGTZAGND_300 (power), D15 MGTZAGND_300 (power), D16 MGTZAGND_300 (power), D17 MGTZAGND_300 (power), D18 MGTZAGND_300 (power), D19 MGTZAGND_300 (power), D20 MGTZAGND_300 (power), D21 MGTZAGND_300 (power), D22 MGTZAGND_300 (power), D23 MGTZAGND_300 (power), D24 MGTZAGND_300 (power), D25 MGTZAGND_300 (power), D26 MGTZAGND_300 (power), D27 MGTZAGND_300 (power), D28 MGTZAGND_300 (power), D29 MGTZAGND_300 (power), D30 MGTZAGND_300 (power), D31 MGTZAGND_300 (power), D32 MGTZAGND_300 (power), D33 MGTZAGND_300 (power), D34 MGTZAGND_300 (power), D35 MGTZAGND_300 (power), D36 MGTZAGND_300 (power), D37 MGTZAGND_300 (power), E18 MGTZ_SENSE_AVCC_300 (power), F18 MGTZ_SENSE_AGND_300 (power), F20 MGTZVCCH_300 (power), F22 MGTZVCCH_300 (power), F24 MGTZVCCH_300 (power), F26 MGTZVCCH_300 (power), G18 MGTZVCCH_300 (power), G26 MGTZ_SENSE_GND_300 (power), G27 MGTZ_SENSE_VCCH_300 (power), H26 MGTZ_SENSE_VCC_300 (power), J19 MGTZVCCH_300 (power), J21 MGTZVCCH_300 (power), J23 MGTZVCCH_300 (power), J25 MGTZVCCH_300 (power), J27 MGTZVCCH_300 (power), K19 MGTZ_SENSE_VCCL_300 (power), K20 MGTZ_SENSE_GNDL_300 (power), L20 MGTZVCCL_300 (power), L22 MGTZVCCL_300 (power), L24 MGTZVCCL_300 (power), L26 MGTZVCCL_300 (power)